# Altium footprint library mastermind.PCBLIB: 1061 footprints (part 66 of 67)
Each footprint in its own frame and in the unit in brackets; x right, y up, seen from the top. Pads: shape width x height; smd on the part's side, far side on the other; paste and mask are expansions set on the pad; w line width, h text height; cw(c..) or ccw(c..) is an arc to the next point about the centre after c.
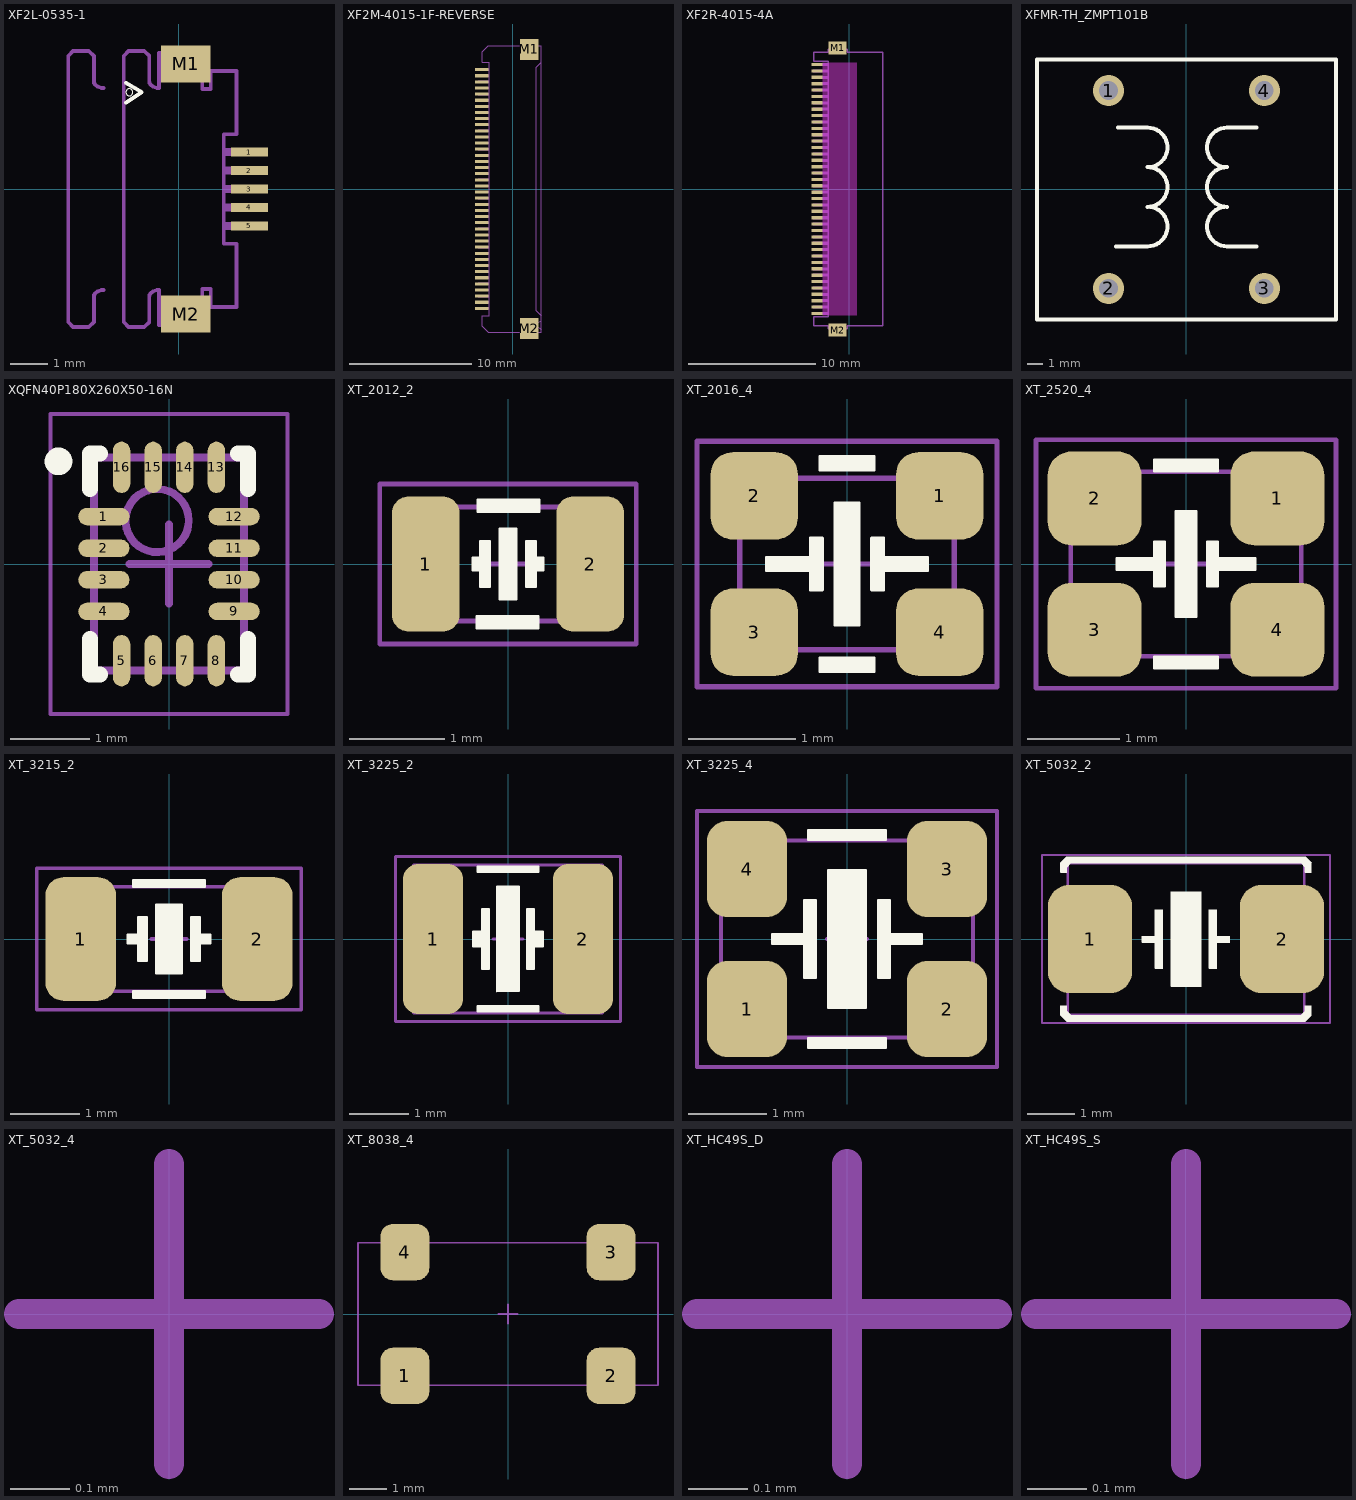
[diagram p65: the footprints below, top view; thin cyan lines are the x and y axes]

## XF2L-0535-1 [mm]
pads (7):
  rect 1x0.25 smd mask-0.5: 1(1.905,1) 2(1.905,0.5) 3(1.905,0) 4(1.905,-0.5) 5(1.905,-1)
  rect 1.34x1 smd: M1(0.18,3.388) M2(0.18,-3.388)
Top Overlay:
  circle w0: c-1.341,2.617 r0.095
  lines w0.102: -1.441,2.332 -1.005,2.617 -1.441,2.872
Top Solder:
  region: 1.355,0.825 1.355,1.175 2.455,1.175 2.455,0.825
  region: 1.355,0.325 1.355,0.675 2.455,0.675 2.455,0.325
  region: 1.355,-0.175 1.355,0.175 2.455,0.175 2.455,-0.175
  region: 1.355,-0.675 1.355,-0.325 2.455,-0.325 2.455,-0.675
  region: 1.355,-1.175 1.355,-0.825 2.455,-0.825 2.455,-1.175
Mechanical 2:
  lines w0.102: -2.04,-2.731 ccw(c-2.04,-3.069) -2.253,-2.806 ccw(c-2.173,-2.906) -2.301,-2.906 -2.301,-3.598 -2.438,-3.735 -2.865,-3.735 -2.995,-3.6 -2.995,3.6 -2.865,3.735 -2.438,3.735 -2.301,3.598 -2.301,2.906 ccw(c-2.173,2.906) -2.253,2.806 ccw(c-2.04,3.069) -2.04,2.731 ; -0.54,-3.683 -0.54,-2.73 ccw(c-0.54,-3.069) -0.754,-2.806 ccw(c-0.673,-2.906) -0.801,-2.906 -0.801,-3.598 -0.939,-3.735 -1.365,-3.735 -1.495,-3.6 -1.495,3.6 -1.365,3.735 -0.939,3.735 -0.801,3.598 -0.801,2.906 ccw(c-0.673,2.906) -0.754,2.806 ccw(c-0.54,3.069) -0.54,2.731 ; 1.538,1.479 1.213,1.479 1.213,-1.479 1.559,-1.479 1.559,-3.19 ; 1.559,1.479 1.559,3.19
Mechanical 8:
  region: 0.105,-3.7 0.105,-3.175 0.805,-3.175 0.805,-3.7
  region: -0.445,-3.7 -0.445,-2.9 0.105,-2.9 0.105,-3.7
  region: 0.105,-3.7 0.105,-3.175 0.805,-3.175 0.805,-3.7
  region: -0.445,-3.7 -0.445,-2.9 0.105,-2.9 0.105,-3.7
  region: 0.105,3.175 0.105,3.7 0.805,3.7 0.805,3.175
  region: -0.445,2.9 -0.445,3.7 0.105,3.7 0.105,2.9
  region: 1.255,0.9 1.255,1.1 1.98,1.1 1.98,0.9
  region: 1.255,0.4 1.255,0.6 1.98,0.6 1.98,0.4
  region: 1.255,-0.1 1.255,0.1 1.98,0.1 1.98,-0.1
  region: 1.255,-0.6 1.255,-0.4 1.98,-0.4 1.98,-0.6
  region: 1.255,-1.1 1.255,-0.9 1.98,-0.9 1.98,-1.1
  lines w0.102: -0.54,-3.683 0.512,-3.683 0.512,-3.2 -0.019,-3.2 -0.019,-3.053 0.63,-3.053 0.63,-2.707 0.858,-2.707 0.858,-3.19 1.559,-3.19 ; -0.54,2.73 -0.54,3.683 0.512,3.683 0.512,3.2 -0.019,3.2 -0.019,3.053 0.63,3.053 0.63,2.707 0.858,2.707 0.858,3.19 1.559,3.19

## XF2M-4015-1F-REVERSE [mm]
pads (42):
  rect 1.1x0.25 smd: 1(-2.54,9.75) 2(-2.54,9.25) 3(-2.54,8.75) 4(-2.54,8.25) 5(-2.54,7.75) 6(-2.54,7.25) 7(-2.54,6.75) 8(-2.54,6.25) 9(-2.54,5.75) 10(-2.54,5.25) 11(-2.54,4.75) 12(-2.54,4.25) 13(-2.54,3.75) 14(-2.54,3.25) 15(-2.54,2.75) 16(-2.54,2.25) 17(-2.54,1.75) 18(-2.54,1.25) 19(-2.54,0.75) 20(-2.54,0.25) 21(-2.54,-0.25) 22(-2.54,-0.75) 23(-2.54,-1.25) 24(-2.54,-1.75) 25(-2.54,-2.25) 26(-2.54,-2.75) 27(-2.54,-3.25) 28(-2.54,-3.75) 29(-2.54,-4.25) 30(-2.54,-4.75) 31(-2.54,-5.25) 32(-2.54,-5.75) 33(-2.54,-6.25) 34(-2.54,-6.75) 35(-2.54,-7.25) 36(-2.54,-7.75) 37(-2.54,-8.25) 38(-2.54,-8.75) 39(-2.54,-9.25) 40(-2.54,-9.75)
  rect 1.5x1.7 smd: M1(1.36,11.4) M2(1.36,-11.4)
Mechanical 2:
  lines w0.102: -2.49,-10.35 -2.49,-11.2 -1.99,-11.7 0.46,-11.7 ; -2.49,10.35 -2.49,11.2 -1.99,11.7 0.46,11.7 ; 2.31,-11.7 2.31,-10.35 ; 2.31,11.7 2.31,10.35 ; 2.31,-10.35 1.91,-9.95 1.91,9.95 2.31,10.35 ; 2.31,-10.35 2.31,10.35
Mechanical 8:
  drawing of 55 lines, arcs and shapes, not listed

## XF2R-4015-4A [mm]
pads (42):
  rect 0.85x0.25 smd mask-0.425: 1(-2.54,9.75) 2(-2.54,9.25) 3(-2.54,8.75) 4(-2.54,8.25) 5(-2.54,7.75) 6(-2.54,7.25) 7(-2.54,6.75) 8(-2.54,6.25) 9(-2.54,5.75) 10(-2.54,5.25) 11(-2.54,4.75) 12(-2.54,4.25) 13(-2.54,3.75) 14(-2.54,3.25) 15(-2.54,2.75) 16(-2.54,2.25) 17(-2.54,1.75) 18(-2.54,1.25) 19(-2.54,0.75) 20(-2.54,0.25) 21(-2.54,-0.25) 22(-2.54,-0.75) 23(-2.54,-1.25) 24(-2.54,-1.75) 25(-2.54,-2.25) 26(-2.54,-2.75) 27(-2.54,-3.25) 28(-2.54,-3.75) 29(-2.54,-4.25) 30(-2.54,-4.75) 31(-2.54,-5.25) 32(-2.54,-5.75) 33(-2.54,-6.25) 34(-2.54,-6.75) 35(-2.54,-7.25) 36(-2.54,-7.75) 37(-2.54,-8.25) 38(-2.54,-8.75) 39(-2.54,-9.25) 40(-2.54,-9.75)
  rect 1.4x1 smd: M1(-0.915,11.05) M2(-0.915,-11.05)
Top Layer keep-out:
  region: 0.585,9.875 0.585,-9.875 -2.09,-9.875 -2.09,9.875
Top Solder:
  drawing of 40 lines, arcs and shapes, not listed
Mechanical 2:
  lines w0.102: -1.665,-10.725 -2.765,-10.725 -2.765,-10 -1.665,-10 -1.665,10 -2.765,10 -2.765,10.725 -1.665,10.725 ; -0.165,-10.725 2.635,-10.725 2.635,10.725 -0.165,10.725
Mechanical 8:
  drawing of 62 lines, arcs and shapes, not listed

## XFMR-TH_ZMPT101B [mm]
pads (4):
  round 2 hole 1.2 paste-2539.97 mask+0.05: 1(-5,6.35) 2(-5,-6.35) 3(5,-6.35) 4(5,6.35)
Top Overlay:
  lines w0.254: -4.52,-3.651 -2.488,-3.651 ccw(c-2.488,-2.381) -2.488,-1.111 ccw(c-2.488,0.159) -2.488,1.429 ccw(c-2.488,2.699) -2.488,3.969 -4.393,3.969 ; 4.497,-3.651 2.592,-3.651 cw(c2.592,-2.381) 2.592,-1.111 cw(c2.592,0.159) 2.592,1.429 cw(c2.592,2.699) 2.592,3.969 4.497,3.969 ; -9.6,-8.35 9.6,-8.35 9.6,8.35 -9.6,8.35 -9.6,-8.35
Mechanical 15:
  region: -9.54,8.35 -9.54,8.375 -9.575,8.41 -9.625,8.41 -9.66,8.375 -9.66,8.35 -9.66,8.325 -9.625,8.29 -9.575,8.29 -9.54,8.325
  region: 5.5,6.35 5.499,6.449 5.422,6.631 5.282,6.77 5.099,6.846 4.901,6.846 4.718,6.77 4.578,6.631 4.501,6.449 4.5,6.35 4.501,6.251 4.578,6.069 4.718,5.93 4.901,5.854 5.099,5.854 5.282,5.93 5.422,6.069 5.499,6.251
  region: 5.5,-6.35 5.499,-6.251 5.422,-6.069 5.282,-5.93 5.099,-5.854 4.901,-5.854 4.718,-5.93 4.578,-6.069 4.501,-6.251 4.5,-6.35 4.501,-6.449 4.578,-6.631 4.718,-6.77 4.901,-6.846 5.099,-6.846 5.282,-6.77 5.422,-6.631 5.499,-6.449
  region: -4.5,-6.35 -4.501,-6.251 -4.578,-6.069 -4.718,-5.93 -4.901,-5.854 -5.099,-5.854 -5.282,-5.93 -5.422,-6.069 -5.499,-6.251 -5.5,-6.35 -5.499,-6.449 -5.422,-6.631 -5.282,-6.77 -5.099,-6.846 -4.901,-6.846 -4.718,-6.77 -4.578,-6.631 -4.501,-6.449
  region: -4.5,6.35 -4.501,6.449 -4.578,6.631 -4.718,6.77 -4.901,6.846 -5.099,6.846 -5.282,6.77 -5.422,6.631 -5.499,6.449 -5.5,6.35 -5.499,6.251 -5.422,6.069 -5.282,5.93 -5.099,5.854 -4.901,5.854 -4.718,5.93 -4.578,6.069 -4.501,6.251
  lines w0.051: -9.6,-8.35 -9.6,8.35 9.6,8.35 9.6,-8.35 -9.6,-8.35
3D body "ZMPT101B.STEP": height 18, standoff -4, extent -9.5,-7.904 9.5,8.096

## XQFN40P180X260X50-16N [mm]
pads (16):
  oval 0.65x0.22 smd paste-0.02 mask+0.062: 1(-0.825,0.6) 2(-0.825,0.2) 3(-0.825,-0.2) 4(-0.825,-0.6) 9(0.825,-0.6) 10(0.825,-0.2) 11(0.825,0.2) 12(0.825,0.6)
  oval 0.22x0.65 smd paste-0.02 mask+0.062: 5(-0.6,-1.225) 6(-0.2,-1.225) 7(0.2,-1.225) 8(0.6,-1.225) 13(0.6,1.225) 14(0.2,1.225) 15(-0.2,1.225) 16(-0.6,1.225)
Top Overlay:
  circle w0.25: c-1.4,1.3 r0.05
  lines w0.2: -1,-0.95 -1,-1.4 -0.875,-1.4 ; -1,0.95 -1,1.4 -0.875,1.4 ; 0.875,-1.4 1,-1.4 1,-0.95 ; 0.875,1.4 1,1.4 1,0.95
Mechanical 13:
  circle w0.1: c-0.15,0.55 r0.4
  lines w0.1: -0.95,-1.35 -0.95,1.35 0.95,1.35 0.95,-1.35 -0.95,-1.35
Mechanical 15:
  lines w0.05: -1.5,-1.9 -1.5,1.9 1.5,1.9 1.5,-1.9 -1.5,-1.9
  lines w0.1: -0.5,0 0.5,0 ; 0,-0.5 0,0.5
3D body "User Library-XQFN-16-1.step": height 0.55, standoff 0, extent -0.91,-1.31 0.91,1.31
3D body: height 0.55, standoff 0.4, extent -0.9,-0.35 0.9,0.35

## XT_2012_2 [mil]
height 25.59
pads (2):
  rrect50% 28x56 smd: 1(-34,0) 2(34,0)
Top Overlay:
  region: 12.5,-26.5 -13,-26.5 -13,-21.5 12.5,-21.5
  region: 11.5,-9.5 7.5,-9.5 7.5,9.5 11.5,9.5 11.5,2.5 14.5,2.5 14.5,-2.5 11.5,-2.5
  region: -3.5,14.5 3.5,14.5 3.5,-14.5 -3.5,-14.5
  region: -11.5,9.5 -7.5,9.5 -7.5,-9.5 -11.5,-9.5 -11.5,-2.5 -14.5,-2.5 -14.5,2.5 -11.5,2.5
  region: -12.5,26.5 13,26.5 13,21.5 -12.5,21.5
  lines w1: -14.5,-2.5 -14.5,2.5 -11.5,2.5 -11.5,9.5 -7.5,9.5 -7.5,-9.5 -11.5,-9.5 -11.5,-2.5 -14.5,-2.5 ; -13,-26.5 12.5,-26.5 12.5,-21.5 -13,-21.5 -13,-26.5 ; -12.5,21.5 13,21.5 13,26.5 -12.5,26.5 -12.5,21.5 ; -3.5,-14.5 3.5,-14.5 3.5,14.5 -3.5,14.5 -3.5,-14.5 ; 7.5,-9.5 7.5,9.5 11.5,9.5 11.5,2.5 14.5,2.5 14.5,-2.5 11.5,-2.5 11.5,-9.5 7.5,-9.5
Mechanical 13:
  lines w2: -10.01,0.01 9.99,0.01 ; 0,-10 0,10 ; -39.37,-23.62 39.37,-23.62 39.37,23.62 -39.37,23.62 -39.37,-23.62
Mechanical 14:
  lines w2: -53,-33 53,-33 53,33 -53,33 -53,-33
  text ".Designator" at -35,-20 h80
3D body "User Library-ABS06.STEP": height 23.62, standoff 0, extent -39.37,-24.01 39.37,24.02

## XT_2016_4 [mil]
height 29.53
pads (4):
  rrect50% 32x32 smd: 1(34,25) 2(-34,25) 3(-34,-25) 4(34,-25)
Top Overlay:
  region: -10,39.5 10,39.5 10,34.5 -10,34.5
  region: -29.5,2.5 -13.5,2.5 -13.5,9.5 -9,9.5 -9,-9.5 -13.5,-9.5 -13.5,-2.5 -29.5,-2.5
  region: -4.5,22.5 4.5,22.5 4.5,-22.5 -4.5,-22.5
  region: 9,9.5 13.5,9.5 13.5,2.5 29.5,2.5 29.5,-2.5 13.5,-2.5 13.5,-9.5 9,-9.5
  region: -10,-34.5 10,-34.5 10,-39.5 -10,-39.5
  lines w1: -29.5,-2.5 -13.5,-2.5 -13.5,-9.5 -9,-9.5 -9,9.5 -13.5,9.5 -13.5,2.5 -29.5,2.5 -29.5,-2.5 ; -10,-39.5 10,-39.5 10,-34.5 -10,-34.5 -10,-39.5 ; -10,34.5 -10,39.5 10,39.5 10,34.5 -10,34.5 ; -4.5,-22.5 4.5,-22.5 4.5,22.5 -4.5,22.5 -4.5,-22.5 ; 9,-9.5 9,9.5 13.5,9.5 13.5,2.5 29.5,2.5 29.5,-2.5 13.5,-2.5 13.5,-9.5 9,-9.5
Mechanical 13:
  lines w2: -10,0.01 10,0.01 ; 0.01,-10 0.01,10 ; -39.37,-31.5 -39.37,31.5 39.37,31.5 39.37,-31.5 -39.37,-31.5
Mechanical 14:
  lines w2: -55,-45 55,-45 55,45 -55,45 -55,-45
  text ".Designator" at -35,-20 h80
3D body "User Library-NT2016SA-END4910A-48MHZ Crystal (NDK).STEP": height 27.56, standoff -0.04, extent -39.37,-31.5 39.37,31.5

## XT_2520_4 [mil]
height 29.53
pads (4):
  rrect50% 40x40 smd: 1(39,28) 2(-39,28) 3(-39,-28) 4(39,-28)
Top Overlay:
  region: -13.5,44.5 13.5,44.5 13.5,39.5 -13.5,39.5
  region: -13.5,-39.5 13.5,-39.5 13.5,-44.5 -13.5,-44.5
  region: -29.5,2.5 -13.5,2.5 -13.5,9.5 -9,9.5 -9,-9.5 -13.5,-9.5 -13.5,-2.5 -29.5,-2.5
  region: -4.5,22.5 4.5,22.5 4.5,-22.5 -4.5,-22.5
  region: 9,9.5 13.5,9.5 13.5,2.5 29.5,2.5 29.5,-2.5 13.5,-2.5 13.5,-9.5 9,-9.5
  lines w1: -29.5,-2.5 -13.5,-2.5 -13.5,-9.5 -9,-9.5 -9,9.5 -13.5,9.5 -13.5,2.5 -29.5,2.5 -29.5,-2.5 ; -13.5,-44.5 13.5,-44.5 13.5,-39.5 -13.5,-39.5 -13.5,-44.5 ; -13.5,39.5 -13.5,44.5 13.5,44.5 13.5,39.5 -13.5,39.5 ; -4.5,-22.5 4.5,-22.5 4.5,22.5 -4.5,22.5 -4.5,-22.5 ; 9,-9.5 9,9.5 13.5,9.5 13.5,2.5 29.5,2.5 29.5,-2.5 13.5,-2.5 13.5,-9.5 9,-9.5
Mechanical 13:
  lines w2: -10,0.01 10,0.01 ; 0.01,-10 0.01,10 ; -49.21,-39.36 -49.21,39.37 49.22,39.37 49.22,-39.36 -49.21,-39.36
Mechanical 14:
  lines w2: -64,-53 64,-53 64,53 -64,53 -64,-53
  text ".Designator" at -35,-20 h80
3D body "User Library-Osc KC2520.STEP": height 31.1, standoff 0, extent -49.21,-39.36 49.22,39.37

## XT_3215_2 [mil]
height 25.59
pads (2):
  rrect50% 40x70 smd: 1(-50,0) 2(50,0)
Top Overlay:
  region: 20.5,-33.5 -20.5,-33.5 -20.5,-29.5 20.5,-29.5
  region: 12.5,12.5 17.5,12.5 17.5,2.5 23.5,2.5 23.5,-2.5 17.5,-2.5 17.5,-12.5 12.5,-12.5
  region: -12.5,-12.5 -17.5,-12.5 -17.5,-2.5 -23.5,-2.5 -23.5,2.5 -17.5,2.5 -17.5,12.5 -12.5,12.5
  region: -7.5,19.5 7.5,19.5 7.5,-19.5 -7.5,-19.5
  region: -20.5,33.5 20.5,33.5 20.5,29.5 -20.5,29.5
  lines w1: -23.5,-2.5 -23.5,2.5 -17.5,2.5 -17.5,12.5 -12.5,12.5 -12.5,-12.5 -17.5,-12.5 -17.5,-2.5 -23.5,-2.5 ; -20.5,-33.5 20.5,-33.5 20.5,-29.5 -20.5,-29.5 -20.5,-33.5 ; -20.5,29.5 -20.5,33.5 20.5,33.5 20.5,29.5 -20.5,29.5 ; -7.5,-19.5 -7.5,19.5 7.5,19.5 7.5,-19.5 -7.5,-19.5 ; 12.5,-12.5 17.5,-12.5 17.5,-2.5 23.5,-2.5 23.5,2.5 17.5,2.5 17.5,12.5 12.5,12.5 12.5,-12.5
Mechanical 13:
  lines w2: -10,0.01 10,0.01 ; 0.01,-10 0.01,10 ; -63,-29.51 62.99,-29.51 62.99,29.53 -63,29.53 -63,-29.51
Mechanical 14:
  lines w2: -75,-40 75,-40 75,40 -75,40 -75,-40
  text ".Designator" at -35,-20 h80
3D body "User Library-ECX-31B.STEP": height 35.43, standoff 0, extent -63,-29.51 62.99,29.55

## XT_3225_2 [mil]
height 25.59
pads (2):
  rrect50% 40x100 smd: 1(-50,0) 2(50,0)
Top Overlay:
  region: -20.5,48.5 20.5,48.5 20.5,44.5 -20.5,44.5
  region: -7.5,35 7.5,35 7.5,-35 -7.5,-35
  region: -12.5,-20 -17.5,-20 -17.5,-5 -23.5,-5 -23.5,5 -17.5,5 -17.5,20 -12.5,20
  region: 12.5,20 17.5,20 17.5,5 23.5,5 23.5,-5 17.5,-5 17.5,-20 12.5,-20
  region: 20.5,-48.5 -20.5,-48.5 -20.5,-44.5 20.5,-44.5
  lines w1: -23.5,-5 -23.5,5 -17.5,5 -17.5,20 -12.5,20 -12.5,-20 -17.5,-20 -17.5,-5 -23.5,-5 ; -20.5,-48.5 -20.5,-44.5 20.5,-44.5 20.5,-48.5 -20.5,-48.5 ; -20.5,44.5 20.5,44.5 20.5,48.5 -20.5,48.5 -20.5,44.5 ; -7.5,-35 7.5,-35 7.5,35 -7.5,35 -7.5,-35 ; 12.5,-20 12.5,20 17.5,20 17.5,5 23.5,5 23.5,-5 17.5,-5 17.5,-20 12.5,-20
Mechanical 13:
  lines w2: -10,0.01 10,0.01 ; 0.01,-10 0.01,10 ; -63,-49.21 62.99,-49.21 62.99,49.21 -63,49.21 -63,-49.21
Mechanical 14:
  lines w2: -75,-55 75,-55 75,55 -75,55 -75,-55
  text ".Designator" at -35,-20 h80
3D body "User Library-SG310.STEP": height 41.34, standoff 0, extent -62.98,-49.21 63,49.21

## XT_3225_4 [mil]
height 47.24
pads (4):
  rrect50% 40x48 smd: 1(-50,-35) 2(50,-35) 3(50,35) 4(-50,35)
Top Overlay:
  region: 19.5,-54.5 -19.5,-54.5 -19.5,-49.5 19.5,-49.5
  region: 21.5,-19.5 15.5,-19.5 15.5,19.5 21.5,19.5 21.5,2.5 37.5,2.5 37.5,-2.5 21.5,-2.5
  region: -21.5,19.5 -15.5,19.5 -15.5,-19.5 -21.5,-19.5 -21.5,-2.5 -37.5,-2.5 -37.5,2.5 -21.5,2.5
  region: -9.5,34.5 9.5,34.5 9.5,-34.5 -9.5,-34.5
  region: -19.5,54.5 19.5,54.5 19.5,49.5 -19.5,49.5
  lines w1: -37.5,-2.5 -37.5,2.5 -21.5,2.5 -21.5,19.5 -15.5,19.5 -15.5,-19.5 -21.5,-19.5 -21.5,-2.5 -37.5,-2.5 ; -19.5,-54.5 -19.5,-49.5 19.5,-49.5 19.5,-54.5 -19.5,-54.5 ; -19.5,49.5 -19.5,54.5 19.5,54.5 19.5,49.5 -19.5,49.5 ; -9.5,-34.5 9.5,-34.5 9.5,34.5 -9.5,34.5 -9.5,-34.5 ; 15.5,-19.5 15.5,19.5 21.5,19.5 21.5,2.5 37.5,2.5 37.5,-2.5 21.5,-2.5 21.5,-19.5 15.5,-19.5
Mechanical 13:
  lines w2: -10,0.01 10,0.01 ; 0.01,-10 0.01,10 ; -63,-49.21 62.99,-49.21 62.99,49.21 -63,49.21 -63,-49.21
Mechanical 14:
  lines w2: -75,-64 -75,64 75,64 75,-64 -75,-64
  text ".Designator" at -35,-20 h80
3D body "User Library-SG310.STEP": height 41.34, standoff 0, extent -62.98,-49.21 63,49.21

## XT_5032_2 [mil]
height 47.24
pads (2):
  rrect50% 70x90 smd: 1(-80,0) 2(80,0)
Top Overlay:
  region: 104.5,-55.5 99.5,-55.5 99.5,-60 96,-63.5 -96,-63.5 -99.5,-60 -99.5,-55.5 -104.5,-55.5 -104.5,-63.5 -99.5,-68.5 99.5,-68.5 104.5,-63.5
  region: -104.5,55.5 -99.5,55.5 -99.5,60 -96,63.5 96,63.5 99.5,60 99.5,55.5 104.5,55.5 104.5,63.5 99.5,68.5 -99.5,68.5 -104.5,63.5
  region: -19.5,24.5 -25.5,24.5 -25.5,2.5 -36.5,2.5 -36.5,-2.5 -25.5,-2.5 -25.5,-24.5 -19.5,-24.5
  region: -12.5,39.5 12.5,39.5 12.5,-39.5 -12.5,-39.5
  region: 19.5,-24.5 25.5,-24.5 25.5,-2.5 36.5,-2.5 36.5,2.5 25.5,2.5 25.5,24.5 19.5,24.5
  lines w1: -104.5,-63.5 -99.5,-68.5 99.5,-68.5 104.5,-63.5 104.5,-55.5 99.5,-55.5 99.5,-60 96,-63.5 -96,-63.5 -99.5,-60 -99.5,-55.5 -104.5,-55.5 -104.5,-63.5 ; -104.5,55.5 -99.5,55.5 -99.5,60 -96,63.5 96,63.5 99.5,60 99.5,55.5 104.5,55.5 104.5,63.5 99.5,68.5 -99.5,68.5 -104.5,63.5 -104.5,55.5 ; -36.5,-2.5 -25.5,-2.5 -25.5,-24.5 -19.5,-24.5 -19.5,24.5 -25.5,24.5 -25.5,2.5 -36.5,2.5 -36.5,-2.5 ; -12.5,-39.5 12.5,-39.5 12.5,39.5 -12.5,39.5 -12.5,-39.5 ; 19.5,-24.5 19.5,24.5 25.5,24.5 25.5,2.5 36.5,2.5 36.5,-2.5 25.5,-2.5 25.5,-24.5 19.5,-24.5
Mechanical 13:
  lines w2: -10,0.01 10,0.01 ; 0.01,-10 0.01,10 ; -98.43,-63 -98.43,62.99 98.43,62.99 98.43,-63 98.42,-63 -98.43,-63
Mechanical 14:
  lines w2: -120,-70 120,-70 120,70 -120,70 -120,-70
  text ".Designator" at -35,-20 h80
3D body "User Library-CRYSTALSMD5X32.STEP": height 39.37, standoff 0, extent -98.42,-63 98.43,62.99

## XT_5032_4 [mm]
height 1.2
Mechanical 13:
  lines w0.051: -0.254,0 0.254,0 ; 0,-0.254 0,0.254
3D body "User Library-CRYSTALSMD5X32.STEP": height 1, standoff 0, extent -2.5,-1.6 2.5,1.6

## XT_8038_4 [mm]
height 2.54
pads (4):
  rrect50% 1.3x1.5 smd: 1(-2.75,-1.65) 2(2.75,-1.65) 3(2.75,1.65) 4(-2.75,1.65)
Mechanical 13:
  lines w0.051: -0.254,0 0.254,0 ; 0,-0.254 0,0.254 ; -4,-1.9 4,-1.9 4,1.9 -4,1.9 -4,-1.9
3D body "SW3dPS-ZM206.STEP": height 2.43, standoff -0.1, extent -4.012,-1.9 3.988,1.9

## XT_HC49S_D [mm]
height 1.2
Mechanical 13:
  lines w0.051: -0.254,0 0.254,0 ; 0,-0.254 0,0.254
3D body "SW3dPS-HP49US.STEP": height 3.5, standoff -4, extent -5.777,-2.186 5.573,2.464

## XT_HC49S_S [mm]
height 1.2
Mechanical 13:
  lines w0.051: -0.254,0 0.254,0 ; 0,-0.254 0,0.254
3D body "User Library-Crystal HC49_US-SM.STEP": height 4.3, standoff 0, extent -6.4,-2.415 6.4,2.415